# Altium footprint library DSUB.PcbLib: 51 footprints (part 2 of 4)
Each footprint in its own frame and in the unit in brackets; x right, y up, seen from the top. Pads: shape width x height; smd on the part's side, far side on the other; paste and mask are expansions set on the pad; w line width, h text height; cw(c..) or ccw(c..) is an arc to the next point about the centre after c.
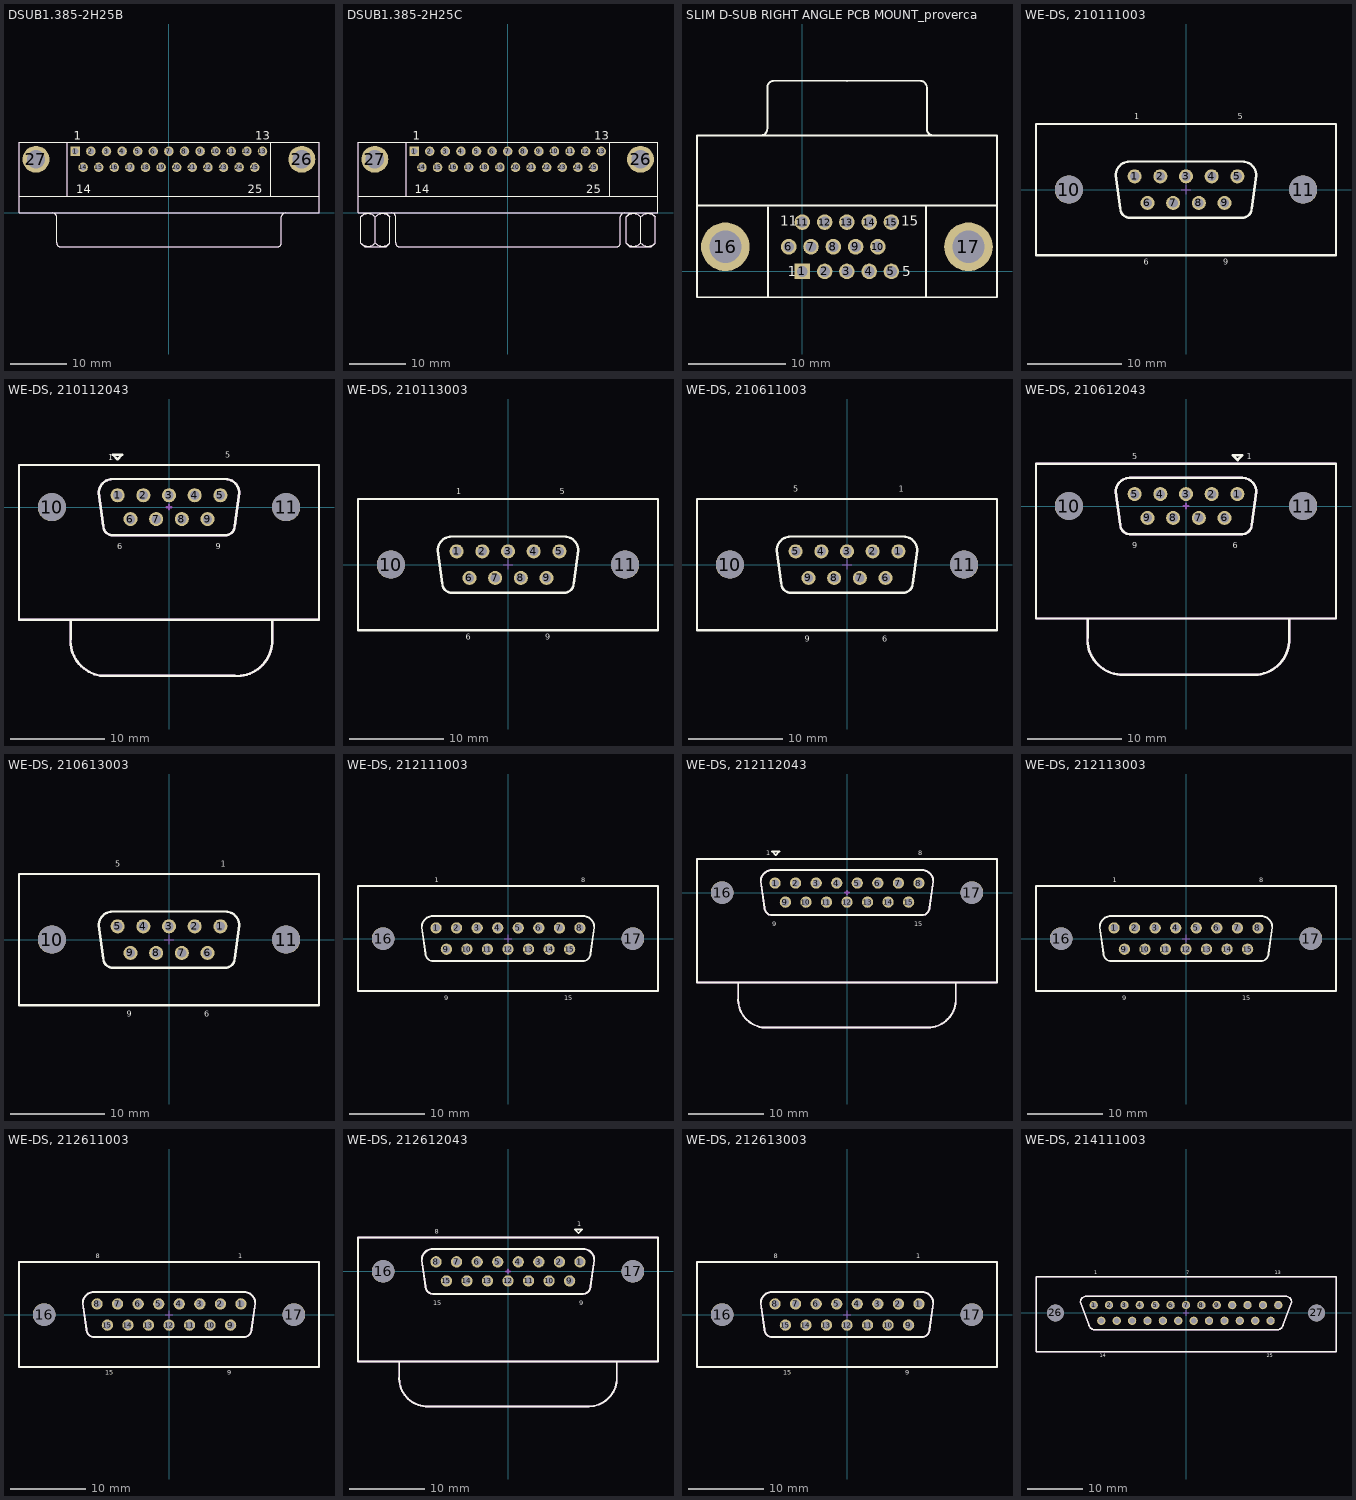
[diagram p1: the footprints below, top view; thin cyan lines are the x and y axes]

## DSUB1.385-2H25B [mm] "Connector; D Subminiature AMPLIMITE 2000; 25 Position; Right Angle"
height 12.93
pads (27):
  rect 1.69x1.69 hole 1.09: 1(-16.566,10.92)
  round 1.69 hole 1.09: 2(-13.805,10.92) 3(-11.044,10.92) 4(-8.283,10.92) 5(-5.522,10.92) 6(-2.761,10.92) 7(0,10.92) 8(2.761,10.92) 9(5.522,10.92) 10(8.283,10.92) 11(11.044,10.92) 12(13.805,10.92) 13(16.566,10.92) 14(-15.185,8.08) 15(-12.424,8.08) 16(-9.663,8.08) 17(-6.902,8.08) 18(-4.141,8.08) 19(-1.38,8.08) 20(1.381,8.08) 21(4.142,8.08) 22(6.903,8.08) 23(9.664,8.08) 24(12.425,8.08) 25(15.186,8.08)
  round 4.76 hole 3.26: 26(23.526,9.5) 27(-23.526,9.5)
Top Overlay:
  lines w0.2: -26.532,3 26.568,3 ; -20.577,-0.005 cw(c-20.577,-0.7) -19.882,-0.7 -19.882,-5.3 ; -19.877,-5.305 ccw(c-19.182,-5.305) -19.182,-6 19.218,-6 ccw(c19.218,-5.305) 19.913,-5.305 ; -17.982,3 -17.982,12.5 ; 18.018,3 18.018,12.5 ; 19.918,-5.3 19.918,-0.7 cw(c20.613,-0.7) 20.613,-0.005 ; -26.532,0 26.568,0 26.568,12.5 -26.532,12.5 -26.532,0
  text "1" at -16.816,12.98 h1.5
  text "13" at 15.316,12.98 h1.5
  text "14" at -16.435,3.48 h1.5
  text "25" at 13.936,3.48 h1.5
Mechanical 13:
  lines w0.1: -26.532,3 26.568,3 ; -20.577,-0.005 cw(c-20.577,-0.7) -19.882,-0.7 -19.882,-5.3 ; -19.877,-5.305 ccw(c-19.182,-5.305) -19.182,-6 19.218,-6 ccw(c19.218,-5.305) 19.913,-5.305 ; -17.982,3 -17.982,12.5 ; 18.018,3 18.018,12.5 ; 19.918,-5.3 19.918,-0.7 cw(c20.613,-0.7) 20.613,-0.005 ; -26.532,0 -26.532,12.5 26.568,12.5 26.568,0 -26.532,0
3D body: height 10.87, standoff 1.88, extent -20,-6 20,0
3D body: height 12.93, standoff 0, extent -26.532,3.001 -17.983,12.499
3D body: height 12.93, standoff 0, extent -26.532,0.001 26.567,2.999
3D body: height 12.93, standoff 0, extent -17.982,3.001 18.017,12.499
3D body: height 12.93, standoff 0, extent 18.018,3.001 26.567,12.499

## DSUB1.385-2H25C [mm] "Connector; D Subminiature AMPLIMITE 2000; 25 Position; Right Angle"
height 12.75
pads (27):
  rect 1.69x1.69 hole 1.09: 1(-16.566,10.92)
  round 1.69 hole 1.09: 2(-13.805,10.92) 3(-11.044,10.92) 4(-8.283,10.92) 5(-5.522,10.92) 6(-2.761,10.92) 7(0,10.92) 8(2.761,10.92) 9(5.522,10.92) 10(8.283,10.92) 11(11.044,10.92) 12(13.805,10.92) 13(16.566,10.92) 14(-15.185,8.08) 15(-12.424,8.08) 16(-9.663,8.08) 17(-6.902,8.08) 18(-4.141,8.08) 19(-1.38,8.08) 20(1.381,8.08) 21(4.142,8.08) 22(6.903,8.08) 23(9.664,8.08) 24(12.425,8.08) 25(15.186,8.08)
  round 4.76 hole 3.26: 26(23.526,9.5) 27(-23.526,9.5)
Top Overlay:
  lines w0.2: -26.496,3 26.604,3 ; -25.988,-5.365 -25.353,-6 -21.543,-6 -20.908,-5.365 ; -25.988,-5.35 -25.988,-0.699 -25.353,-0.064 ; -25.988,-4.298 -25.988,-4.086 ; -23.448,-5.35 -23.448,-0.699 ; -21.543,-0.064 -20.908,-0.699 -20.908,-5.35 ; -20.541,-0.005 cw(c-20.541,-0.7) -19.846,-0.7 -19.846,-5.3 ; -19.841,-5.305 ccw(c-19.146,-5.305) -19.146,-6 19.254,-6 ccw(c19.254,-5.305) 19.949,-5.305 ; -17.946,3 -17.946,12.5 ; 18.054,3 18.054,12.5 ; 19.954,-5.3 19.954,-0.7 cw(c20.649,-0.7) 20.649,-0.005 ; 21.012,-5.365 21.647,-6 25.457,-6 26.092,-5.365 ; 21.012,-5.35 21.012,-0.699 21.647,-0.064 ; 21.012,-4.298 21.012,-4.086 ; 23.552,-5.35 23.552,-0.699 ; 25.457,-0.064 26.092,-0.699 26.092,-5.35 ; -26.496,0 26.604,0 26.604,12.5 -26.496,12.5 -26.496,0
  lines w0.203: -25.99,-0.697 cw(c-24.718,-1.969) -23.446,-0.697 ; -25.988,-5.35 ccw(c-24.716,-4.078) -23.444,-5.35 ; -23.453,-5.35 ccw(c-22.18,-4.078) -20.908,-5.35 ; -23.45,-0.697 cw(c-22.178,-1.969) -20.906,-0.697 ; 21.01,-0.697 cw(c22.282,-1.969) 23.554,-0.697 ; 21.012,-5.35 ccw(c22.284,-4.078) 23.556,-5.35 ; 23.547,-5.35 ccw(c24.82,-4.078) 26.092,-5.35 ; 23.55,-0.697 cw(c24.822,-1.969) 26.094,-0.697
  text "1" at -16.816,12.98 h1.5
  text "13" at 15.316,12.98 h1.5
  text "14" at -16.435,3.48 h1.5
  text "25" at 13.936,3.48 h1.5
Mechanical 13:
  lines w0.1: -26.496,3 26.604,3 ; -25.99,-0.697 cw(c-24.718,-1.969) -23.446,-0.697 ; -25.988,-5.365 -25.353,-6 -21.543,-6 -20.908,-5.365 ; -25.988,-4.298 -25.988,-4.086 ; -25.353,-0.064 -25.988,-0.699 -25.988,-5.35 ccw(c-24.716,-4.078) -23.444,-5.35 ; -23.453,-5.35 ccw(c-22.18,-4.078) -20.908,-5.35 -20.908,-0.699 -21.543,-0.064 ; -23.45,-0.697 cw(c-22.178,-1.969) -20.906,-0.697 ; -23.448,-5.35 -23.448,-0.699 ; -20.541,-0.005 cw(c-20.541,-0.7) -19.846,-0.7 -19.846,-5.3 ; -19.841,-5.305 ccw(c-19.146,-5.305) -19.146,-6 19.254,-6 ccw(c19.254,-5.305) 19.949,-5.305 ; -17.946,3 -17.946,12.5 ; 18.054,3 18.054,12.5 ; 19.954,-5.3 19.954,-0.7 cw(c20.649,-0.7) 20.649,-0.005 ; 21.01,-0.697 cw(c22.282,-1.969) 23.554,-0.697 ; 21.012,-5.365 21.647,-6 25.457,-6 26.092,-5.365 ; 21.012,-4.298 21.012,-4.086 ; 21.647,-0.064 21.012,-0.699 21.012,-5.35 ccw(c22.284,-4.078) 23.556,-5.35 ; 23.547,-5.35 ccw(c24.82,-4.078) 26.092,-5.35 26.092,-0.699 25.457,-0.064 ; 23.55,-0.697 cw(c24.822,-1.969) 26.094,-0.697 ; 23.552,-5.35 23.552,-0.699 ; -26.496,0 -26.496,12.5 26.604,12.5 26.604,0 -26.496,0
3D body: height 12.75, standoff 0, extent 18.055,3.001 26.603,12.499
3D body: height 12.75, standoff 0, extent -17.945,3.001 18.053,12.499
3D body: height 8.87, standoff 3.88, extent 21.003,-5.886 25.983,0.114
3D body: height 12.75, standoff 0, extent -26.495,3.001 -17.947,12.499
3D body: height 12.75, standoff 0, extent -26.495,0.001 26.603,2.999
3D body: height 8.87, standoff 3.88, extent -25.997,-5.886 -21.017,0.114
3D body: height 10.87, standoff 1.88, extent -20,-6 20,0

## SLIM D-SUB RIGHT ANGLE PCB MOUNT_proverca [mm] "High density D sub 15 pin Female connector"
height 1
pads (17):
  rect 1.6x1.6 hole 1.1: 1(0,0)
  round 1.6 hole 1.1: 2(2.29,0) 3(4.58,0) 4(6.87,0) 5(9.16,0) 6(-1.4,2.54) 7(0.89,2.54) 8(3.18,2.54) 9(5.47,2.54) 10(7.76,2.54) 11(0,5.08) 12(2.29,5.08) 13(4.58,5.08) 14(6.87,5.08) 15(9.16,5.08)
  round 5 hole 3.3: 16(-7.915,2.54) 17(17.075,2.54)
Top Overlay:
  lines w0.2: -10.83,6.77 20.01,6.77 ; -4.3,13.975 ccw(c-4.3,14.67) -3.605,14.67 -3.605,18.91 cw(c-2.91,18.91) -2.91,19.605 4.595,19.59 12.1,19.605 cw(c12.1,18.91) 12.795,18.91 12.795,14.67 ccw(c13.49,14.67) 13.49,13.975 ; -3.535,-2.65 -3.535,6.57 ; 12.725,-2.65 12.725,6.65 ; -10.83,-2.65 -10.83,13.97 20.01,13.97 20.01,-2.65 -10.83,-2.65
  text "11" at -2.286,4.699 h1
  text "5" at 10.287,-0.508 h1
  text "15" at 10.16,4.699 h1
  text "1" at -1.524,-0.508 h1
3D body "User Library-SLIM D-SUB RIGHT ANGLE PCB MOUNT.step": height 10.75, standoff -2.59, extent -10.828,6.088 19.972,19.558

## WE-DS, 210111003 [mm] "D-SUB- 9P, MALE, STRAIGHT, TH"
height 12
pads (11):
  round 1.5 hole 1 unplated: 1(-5.48,1.42) 2(-2.74,1.42) 3(0,1.42) 4(2.74,1.42) 5(5.48,1.42) 6(-4.11,-1.42) 7(-1.37,-1.42) 8(1.37,-1.42) 9(4.11,-1.42)
  round 3 hole 3 unplated: 10(-12.5,0) 11(12.5,0)
Top Overlay:
  lines w0.254: -5.996,-3.004 cw(c-5.996,-2) -7,-2 -7.5,1.5 cw(c-6,1.5) -6,3 6,3 cw(c6,1.5) 7.5,1.5 7,-2 cw(c5.996,-2) 5.996,-3.004 ; -5.996,-3 6,-3 ; -16,-7 -16,0 -16,7 16,7 16,-7 -16,-7
  text "6" at -4.5,-8 h0.64
  text "9" at 4,-8 h0.64
  text "1" at -5.5,7.5 h0.64
  text "5" at 5.5,7.5 h0.64
Mechanical 15:
  lines w0.102: -0.5,0 0.5,0 ; 0,-0.5 0,0.5
3D body "210111003.stp": height 12.5, standoff -4.5, extent -15.4,-6.2 15.4,6.2

## WE-DS, 210112043 [mm] "D-SUB- 9P, MALE, RT ANGLE, TH"
height 12
pads (11):
  round 1.5 hole 1 unplated: 1(-5.48,1.27) 2(-2.74,1.27) 3(0,1.27) 4(2.74,1.27) 5(5.48,1.27) 6(-4.11,-1.27) 7(-1.37,-1.27) 8(1.37,-1.27) 9(4.11,-1.27)
  round 3 hole 3 unplated: 10(-12.5,0) 11(12.5,0)
Top Overlay:
  lines w0.254: -10.5,-12 -10.5,-14 ccw(c-6.75,-14.25) -7,-18 7,-18 ccw(c7.25,-14.25) 11,-14.5 11,-12 ; -5.996,-3.004 cw(c-5.996,-2) -7,-2 -7.5,1.5 cw(c-6,1.5) -6,3 6,3 cw(c6,1.5) 7.5,1.5 7,-2 cw(c5.996,-2) 5.996,-3.004 ; -5.996,-3 6,-3 ; -5.5,5.1 -6,5.6 -5,5.6 -5.5,5.1 ; -5.5,5.1 -5.5,5.1 ; -16,-12 -16,0 -16,4.5 16,4.5 16,-12 -16,-12
  text "6" at -5.5,-4.5 h0.64
  text "9" at 5,-4.5 h0.64
  text "5" at 6,5.25 h0.64
  text "1" at -6.5,5 h0.64
Mechanical 15:
  lines w0.254: -10.5,-12 -10.5,-14 ccw(c-6.75,-14.25) -7,-18 7,-18 ccw(c7.25,-14.25) 11,-14.5 11,-12 ; -5.996,-3.004 cw(c-5.996,-2) -7,-2 -7.5,1.5 cw(c-6,1.5) -6,3 6,3 cw(c6,1.5) 7.5,1.5 7,-2 cw(c5.996,-2) 5.996,-3.004 ; -5.996,-3 6,-3 ; -0.25,0 0.25,0 ; 0,-0.25 0,0.25 ; -16,-12 16,-12 16,4.5 -16,4.5 -16,0 -16,-12
3D body "210112043.stp": height 13.2, standoff -3.6, extent -15.4,-17.5 15.4,4.2

## WE-DS, 210113003 [mm] "D-SUB- 9P, MALE, SOLDER BUCKET VERTICAL MOUNT, TH"
height 12
pads (11):
  round 1.5 hole 1 unplated: 1(-5.48,1.42) 2(-2.74,1.42) 3(0,1.42) 4(2.74,1.42) 5(5.48,1.42) 6(-4.11,-1.42) 7(-1.37,-1.42) 8(1.37,-1.42) 9(4.11,-1.42)
  round 3 hole 3 unplated: 10(-12.5,0) 11(12.5,0)
Top Overlay:
  lines w0.254: -5.996,-3.004 cw(c-5.996,-2) -7,-2 -7.5,1.5 cw(c-6,1.5) -6,3 6,3 cw(c6,1.5) 7.5,1.5 7,-2 cw(c5.996,-2) 5.996,-3.004 ; -5.996,-3 6,-3 ; -16,-7 -16,0 -16,7 16,7 16,-7 -16,-7
  text "6" at -4.5,-8 h0.64
  text "9" at 4,-8 h0.64
  text "1" at -5.5,7.5 h0.64
  text "5" at 5.5,7.5 h0.64
Mechanical 15:
  lines w0.102: -0.5,0 0.5,0 ; 0,-0.5 0,0.5
3D body "210113003.stp": height 12.5, standoff -4.8, extent -15.4,-6.2 15.4,6.2

## WE-DS, 210611003 [mm] "D-SUB- 9P, FEMALE, STRAIGHT, TH"
height 12
pads (11):
  round 1.5 hole 1 unplated: 1(5.48,1.42) 2(2.74,1.42) 3(0,1.42) 4(-2.74,1.42) 5(-5.48,1.42) 6(4.11,-1.42) 7(1.37,-1.42) 8(-1.37,-1.42) 9(-4.11,-1.42)
  round 3 hole 3 unplated: 10(-12.5,0) 11(12.5,0)
Top Overlay:
  lines w0.254: -5.996,-3.004 cw(c-5.996,-2) -7,-2 -7.5,1.5 cw(c-6,1.5) -6,3 6,3 cw(c6,1.5) 7.5,1.5 7,-2 cw(c5.996,-2) 5.996,-3.004 ; -5.996,-3 6,-3 ; -16,-7 16,-7 16,7 -16,7 -16,0 -16,-7
  text "9" at -4.5,-8.25 h0.64
  text "6" at 3.75,-8.25 h0.64
  text "1" at 5.5,7.75 h0.64
  text "5" at -5.75,7.75 h0.64
Mechanical 15:
  lines w0.102: -0.5,0 0.5,0 ; 0,-0.5 0,0.5
3D body "210611003.stp": height 12.65, standoff -4.5, extent -15.4,-6.2 15.4,6.2

## WE-DS, 210612043 [mm] "D-SUB- 9P, FEMALE, RT ANGLE, TH"
height 12
pads (11):
  round 1.5 hole 1 unplated: 1(5.48,1.27) 2(2.74,1.27) 3(0,1.27) 4(-2.74,1.27) 5(-5.48,1.27) 6(4.11,-1.27) 7(1.37,-1.27) 8(-1.37,-1.27) 9(-4.11,-1.27)
  round 3 hole 3 unplated: 10(-12.5,0) 11(12.5,0)
Top Overlay:
  lines w0.254: -10.5,-12 -10.5,-14 ccw(c-6.75,-14.25) -7,-18 7,-18 ccw(c7.25,-14.25) 11,-14.5 11,-12 ; -5.996,-3.004 cw(c-5.996,-2) -7,-2 -7.5,1.5 cw(c-6,1.5) -6,3 6,3 cw(c6,1.5) 7.5,1.5 7,-2 cw(c5.996,-2) 5.996,-3.004 ; -5.996,-3 6,-3 ; 5.5,4.9 6,5.4 5,5.4 5.5,4.9 ; 5.5,4.9 5.5,4.9 ; -16,-12 -16,0 -16,4.5 16,4.5 16,-12 -16,-12
  text "6" at 5,-4.5 h0.64
  text "9" at -5.75,-4.5 h0.64
  text "5" at -5.75,5 h0.64
  text "1" at 6.5,5 h0.64
Mechanical 15:
  lines w0.254: -10.5,-12 -10.5,-14 ccw(c-6.75,-14.25) -7,-18 7,-18 ccw(c7.25,-14.25) 11,-14.5 11,-12 ; -5.996,-3.004 cw(c-5.996,-2) -7,-2 -7.5,1.5 cw(c-6,1.5) -6,3 6,3 cw(c6,1.5) 7.5,1.5 7,-2 cw(c5.996,-2) 5.996,-3.004 ; -5.996,-3 6,-3 ; -0.25,0 0.25,0 ; 0,-0.25 0,0.25 ; -16,-12 16,-12 16,4.5 -16,4.5 -16,0 -16,-12
3D body "210612043.stp": height 13.2, standoff -3.6, extent -15.4,-17.65 15.4,4.2

## WE-DS, 210613003 [mm] "D-SUB- 9P, FEMALE, SOLDER BUCKET VERTICAL MOUNT, TH"
height 12
pads (11):
  round 1.5 hole 1 unplated: 1(5.48,1.42) 2(2.74,1.42) 3(0,1.42) 4(-2.74,1.42) 5(-5.48,1.42) 6(4.11,-1.42) 7(1.37,-1.42) 8(-1.37,-1.42) 9(-4.11,-1.42)
  round 3 hole 3 unplated: 10(-12.5,0) 11(12.5,0)
Top Overlay:
  lines w0.254: -5.996,-3.004 cw(c-5.996,-2) -7,-2 -7.5,1.5 cw(c-6,1.5) -6,3 6,3 cw(c6,1.5) 7.5,1.5 7,-2 cw(c5.996,-2) 5.996,-3.004 ; -5.996,-3 6,-3 ; -16,-7 -16,0 -16,7 16,7 16,-7 -16,-7
  text "5" at -5.75,7.75 h0.64
  text "1" at 5.5,7.75 h0.64
  text "6" at 3.75,-8.25 h0.64
  text "9" at -4.5,-8.25 h0.64
Mechanical 15:
  lines w0.102: -0.5,0 0.5,0 ; 0,-0.5 0,0.5
3D body "210613003.stp": height 12.65, standoff -4.8, extent -15.4,-6.2 15.4,6.2

## WE-DS, 212111003 [mm] "D-SUB- 15P, MALE, STRAIGHT, TH"
height 12
pads (17):
  round 1.5 hole 1 unplated: 1(-9.59,1.42) 2(-6.85,1.42) 3(-4.11,1.42) 4(-1.37,1.42) 5(1.37,1.42) 6(4.11,1.42) 7(6.85,1.42) 8(9.59,1.42) 9(-8.22,-1.42) 10(-5.48,-1.42) 11(-2.74,-1.42) 12(0,-1.42) 13(2.74,-1.42) 14(5.48,-1.42) 15(8.22,-1.42)
  round 3 hole 3 unplated: 16(-16.65,0) 17(16.65,0)
Top Overlay:
  lines w0.254: 9.996,-3.004 ccw(c9.996,-2) 11,-2 11.5,1.5 ccw(c10,1.5) 10,3 -10,3 ccw(c-10,1.5) -11.5,1.5 -11,-2 ccw(c-9.996,-2) -9.996,-3.004 9.996,-2.999 ; -20,-7 -20,0 -20,7 20,7 20,-7 -20,-7
  text "9" at -8.5,-8.25 h0.64
  text "15" at 7.5,-8.25 h0.64
  text "8" at 9.75,7.5 h0.64
  text "1" at -9.75,7.5 h0.64
Mechanical 15:
  lines w0.102: -0.5,0 0.5,0 ; 0,-0.5 0,0.5
3D body "212111003.stp": height 12.5, standoff -4.5, extent -19.6,-6.2 19.6,6.2

## WE-DS, 212112043 [mm] "D-SUB- 15P, MALE, RT ANGLE, TH"
height 12
pads (17):
  round 1.5 hole 1 unplated: 1(-9.59,1.27) 2(-6.85,1.27) 3(-4.11,1.27) 4(-1.37,1.27) 5(1.37,1.27) 6(4.11,1.27) 7(6.85,1.27) 8(9.59,1.27) 9(-8.22,-1.27) 10(-5.48,-1.27) 11(-2.74,-1.27) 12(0,-1.27) 13(2.74,-1.27) 14(5.48,-1.27) 15(8.22,-1.27)
  round 3 hole 3 unplated: 16(-16.65,0) 17(16.65,0)
Top Overlay:
  lines w0.254: -14.5,-12 -14.5,-14 ccw(c-10.75,-14.25) -11,-18 10.5,-18 ccw(c10.75,-14.25) 14.5,-14.5 14.5,-12 ; 9.996,-3.004 ccw(c9.996,-2) 11,-2 11.5,1.5 ccw(c10,1.5) 10,3 -10,3 ccw(c-10,1.5) -11.5,1.5 -11,-2 ccw(c-9.996,-2) -9.996,-3.004 9.996,-2.999 ; -9.5,5 -10,5.5 -9,5.5 -9.5,5 ; -9.5,5 -9.5,5 ; -20,-12 20,-12 20,4.5 -20,4.5 -20,0 -20,-12
  text "1" at -10.75,5 h0.64
  text "8" at 9.5,5 h0.64
  text "9" at -10,-4.5 h0.64
  text "15" at 9,-4.5 h0.64
Mechanical 15:
  lines w0.254: -14.5,-12 -14.5,-14 ccw(c-10.75,-14.25) -11,-18 10.5,-18 ccw(c10.75,-14.25) 14.5,-14.5 14.5,-12 ; -0.25,0 0.25,0 ; 0,-0.25 0,0.25 ; 9.996,-3.004 ccw(c9.996,-2) 11,-2 11.5,1.5 ccw(c10,1.5) 10,3 -10,3 ccw(c-10,1.5) -11.5,1.5 -11,-2 ccw(c-9.996,-2) -9.996,-3.004 9.996,-2.999 ; -20,-12 -20,0 -20,4.5 20,4.5 20,-12 -20,-12
3D body "212112043.stp": height 13.2, standoff -3.6, extent -19.6,-17.5 19.6,4.2

## WE-DS, 212113003 [mm] "D-SUB- 15P, MALE, SOLDER BUCKET, TH"
height 12
pads (17):
  round 1.5 hole 1 unplated: 1(-9.59,1.42) 2(-6.85,1.42) 3(-4.11,1.42) 4(-1.37,1.42) 5(1.37,1.42) 6(4.11,1.42) 7(6.85,1.42) 8(9.59,1.42) 9(-8.22,-1.42) 10(-5.48,-1.42) 11(-2.74,-1.42) 12(0,-1.42) 13(2.74,-1.42) 14(5.48,-1.42) 15(8.22,-1.42)
  round 3 hole 3 unplated: 16(-16.65,0) 17(16.65,0)
Top Overlay:
  lines w0.254: 9.996,-3.004 ccw(c9.996,-2) 11,-2 11.5,1.5 ccw(c10,1.5) 10,3 -10,3 ccw(c-10,1.5) -11.5,1.5 -11,-2 ccw(c-9.996,-2) -9.996,-3.004 9.996,-2.999 ; -20,-7 20,-7 20,7 -20,7 -20,0 -20,-7
  text "1" at -9.75,7.5 h0.64
  text "8" at 9.75,7.5 h0.64
  text "15" at 7.5,-8.25 h0.64
  text "9" at -8.5,-8.25 h0.64
Mechanical 15:
  lines w0.102: -0.5,0 0.5,0 ; 0,-0.5 0,0.5
3D body "212113003.stp": height 12.5, standoff -4.8, extent -19.6,-6.2 19.6,6.2

## WE-DS, 212611003 [mm] "D-SUB- 15P, FEMALE, STRAIGHT, TH"
height 12
pads (17):
  round 1.5 hole 1 unplated: 1(9.59,1.42) 2(6.85,1.42) 3(4.11,1.42) 4(1.37,1.42) 5(-1.37,1.42) 6(-4.11,1.42) 7(-6.85,1.42) 8(-9.59,1.42) 9(8.22,-1.42) 10(5.48,-1.42) 11(2.74,-1.42) 12(0,-1.42) 13(-2.74,-1.42) 14(-5.48,-1.42) 15(-8.22,-1.42)
  round 3 hole 3 unplated: 16(-16.65,0) 17(16.65,0)
Top Overlay:
  lines w0.254: 9.996,-3.004 ccw(c9.996,-2) 11,-2 11.5,1.5 ccw(c10,1.5) 10,3 -10,3 ccw(c-10,1.5) -11.5,1.5 -11,-2 ccw(c-9.996,-2) -9.996,-3.004 9.996,-2.999 ; -20,-7 -20,0 -20,7 20,7 20,-7 -20,-7
  text "9" at 7.75,-8 h0.64
  text "1" at 9.25,7.5 h0.64
  text "8" at -9.75,7.5 h0.64
  text "15" at -8.5,-8 h0.64
Mechanical 15:
  lines w0.102: -0.5,0 0.5,0 ; 0,-0.5 0,0.5
  lines w0.254: 9.996,-3.004 ccw(c9.996,-2) 11,-2 11.5,1.5 ccw(c10,1.5) 10,3 -10,3 ccw(c-10,1.5) -11.5,1.5 -11,-2 ccw(c-9.996,-2) -9.996,-3.004 9.996,-2.999 ; -20,-7 20,-7 20,7 -20,7 -20,0 -20,-7
3D body "212611003.stp": height 12.65, standoff -4.5, extent -19.6,-6.2 19.6,6.2

## WE-DS, 212612043 [mm] "D-SUB- 15P, FEMALE, RT ANGLE, TH"
height 12
pads (17):
  round 1.5 hole 1 unplated: 1(9.59,1.27) 2(6.85,1.27) 3(4.11,1.27) 4(1.37,1.27) 5(-1.37,1.27) 6(-4.11,1.27) 7(-6.85,1.27) 8(-9.59,1.27) 9(8.22,-1.27) 10(5.48,-1.27) 11(2.74,-1.27) 12(0,-1.27) 13(-2.74,-1.27) 14(-5.48,-1.27) 15(-8.22,-1.27)
  round 3 hole 3 unplated: 16(-16.65,0) 17(16.65,0)
Top Overlay:
  lines w0.254: -14.5,-12 -14.5,-14 ccw(c-10.75,-14.25) -11,-18 10.5,-18 ccw(c10.75,-14.25) 14.5,-14.5 14.5,-12 ; 9.996,-3.004 ccw(c9.996,-2) 11,-2 11.5,1.5 ccw(c10,1.5) 10,3 -10,3 ccw(c-10,1.5) -11.5,1.5 -11,-2 ccw(c-9.996,-2) -9.996,-3.004 9.996,-2.999 ; -20,-12 -20,0 -20,4.5 20,4.5 20,-12 -20,-12 ; 8.9,5.6 9.9,5.6 9.4,5.1 8.9,5.6
  text "15" at -10,-4.5 h0.64
  text "9" at 9.5,-4.5 h0.64
  text "1" at 9.25,6 h0.64
  text "8" at -9.75,5 h0.64
Mechanical 15:
  lines w0.254: -14.5,-12 -14.5,-14 ccw(c-10.75,-14.25) -11,-18 10.5,-18 ccw(c10.75,-14.25) 14.5,-14.5 14.5,-12 ; -0.25,0 0.25,0 ; 0,-0.25 0,0.25 ; 9.996,-3.004 ccw(c9.996,-2) 11,-2 11.5,1.5 ccw(c10,1.5) 10,3 -10,3 ccw(c-10,1.5) -11.5,1.5 -11,-2 ccw(c-9.996,-2) -9.996,-3.004 9.996,-2.999 ; -20,-12 20,-12 20,4.5 -20,4.5 -20,0 -20,-12
3D body "212612043.stp": height 13.2, standoff -3.6, extent -19.6,-17.65 19.6,4.2

## WE-DS, 212613003 [mm] "D-SUB- 15P, FEMALE, SOLDER BUCKET, TH"
height 12
pads (17):
  round 1.5 hole 1 unplated: 1(9.59,1.42) 2(6.85,1.42) 3(4.11,1.42) 4(1.37,1.42) 5(-1.37,1.42) 6(-4.11,1.42) 7(-6.85,1.42) 8(-9.59,1.42) 9(8.22,-1.42) 10(5.48,-1.42) 11(2.74,-1.42) 12(0,-1.42) 13(-2.74,-1.42) 14(-5.48,-1.42) 15(-8.22,-1.42)
  round 3 hole 3 unplated: 16(-16.65,0) 17(16.65,0)
Top Overlay:
  lines w0.254: 9.996,-3.004 ccw(c9.996,-2) 11,-2 11.5,1.5 ccw(c10,1.5) 10,3 -10,3 ccw(c-10,1.5) -11.5,1.5 -11,-2 ccw(c-9.996,-2) -9.996,-3.004 9.996,-2.999 ; -20,-7 -20,0 -20,7 20,7 20,-7 -20,-7
  text "9" at 7.75,-8 h0.64
  text "1" at 9.25,7.5 h0.64
  text "8" at -9.75,7.5 h0.64
  text "15" at -8.5,-8 h0.64
Mechanical 15:
  lines w0.102: -0.5,0 0.5,0 ; 0,-0.5 0,0.5
  lines w0.254: 9.996,-3.004 ccw(c9.996,-2) 11,-2 11.5,1.5 ccw(c10,1.5) 10,3 -10,3 ccw(c-10,1.5) -11.5,1.5 -11,-2 ccw(c-9.996,-2) -9.996,-3.004 9.996,-2.999 ; -20,-7 20,-7 20,7 -20,7 -20,0 -20,-7
3D body "212613003.stp": height 12.65, standoff -4.8, extent -19.6,-6.2 19.6,6.2

## WE-DS, 214111003 [mm] "D-SUB- 25P, MALE, STRAIGHT, TH"
height 12
pads (27):
  round 1.5 hole 1 unplated: 1(-16.62,1.42) 2(-13.85,1.42) 3(-11.08,1.42) 4(-8.31,1.42) 5(-5.54,1.42) 6(-2.77,1.42) 7(0,1.42) 8(2.77,1.42) 9(5.54,1.42) 10(8.31,1.42) 11(11.08,1.42) 12(13.85,1.42) 13(16.62,1.42) 14(-15.24,-1.42) 15(-12.47,-1.42) 16(-9.7,-1.42) 17(-6.93,-1.42) 18(-4.16,-1.42) 19(-1.39,-1.42) 20(1.38,-1.42) 21(4.15,-1.42) 22(6.92,-1.42) 23(9.69,-1.42) 24(12.46,-1.42) 25(15.23,-1.42)
  round 3 hole 3 unplated: 26(-23.5,0) 27(23.5,0)
Top Overlay:
  lines w0.254: -27,-7 27,-7 27,6.5 -27,6.5 -27,-7 ; -19,2 cw(c-18,2) -18,3 18,3 cw(c18,2) 19,2 17.5,-2 cw(c16.5,-2) 16.5,-3 -16.5,-3 cw(c-16.5,-2) -17.5,-2 -19,2
  text "1" at -16.5,7 h0.64
  text "7" at 0,7 h0.64
  text "13" at 16,7 h0.64
  text "25" at 14.5,-8 h0.64
  text "14" at -15.5,-8 h0.64
Mechanical 15:
  lines w0.102: -0.5,0 0.5,0 ; 0,-0.5 0,0.5
  lines w0.254: -27,-7 -27,6.5 27,6.5 27,-7 -27,-7 ; -19,2 cw(c-18,2) -18,3 18,3 cw(c18,2) 19,2 17.5,-2 cw(c16.5,-2) 16.5,-3 -16.5,-3 cw(c-16.5,-2) -17.5,-2 -19,2
3D body "214111003.stp": height 12.5, standoff -4.5, extent -26.65,-6.4 26.45,6